# Altium integrated library WE_WR-TBL_Pluggable System_5.00 mm_rev15b.IntLib: 66 symbols
Pins are listed as number, name and electrical type; pins without a type are passive.

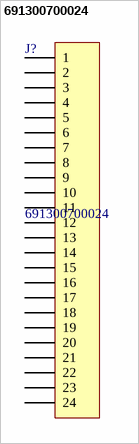
[diagram p0: symbol 691300700024]

## 691300700024
designator J?
WR-TBL Terminal block - serie 300 - 5.00mm; Manufacturer: Würth Elektronik eiSos GmbH; ComponentLink1 Description: Manufacturer; ComponentLink2 Description: Datasheet; NoPins: 24; Created Date: 6 January 2014; partNo: 691300700024; ComponentLink1URL: http://www.we-online.com; ComponentLink2URL: http://katalog.we-online.de/em/datasheet/6913007000xx.pdf; Created by: Karrer Zheng
footprint 691300700024 (5.0mm pin header - 24p)
pins: 1, 2, 3, 4, 5, 6, 7, 8, 9, 10, 11, 12, 13, 14, 15, 16, 17, 18, 19, 20, 21, 22, 23, 24


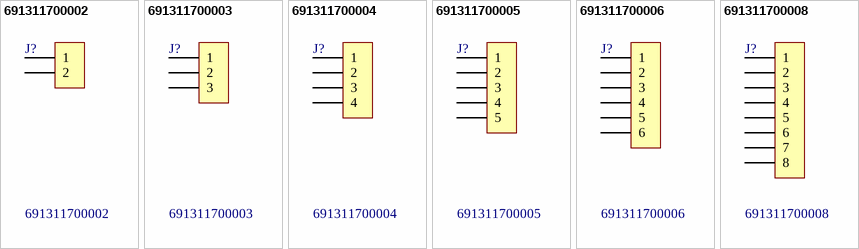
[diagram p1: symbols 691311700002 to 691311700008]

## 691311700002
designator J?
WR-TBL Terminal block - serie 3117 - 5.00mm; Manufacturer: Würth Elektronik eiSos GmbH; ComponentLink1 Description: Manufacturer; ComponentLink2 Description: Datasheet; NoPins: 02; Created Date: 6 January 2014; partNo: 691311700002; ComponentLink1URL: http://www.we-online.com; ComponentLink2URL: http://katalog.we-online.de/em/datasheet/6913117000xx.pdf; Created by: Karrer Zheng
footprint 691311700002
pins: 1, 2

## 691311700003
designator J?
WR-TBL Terminal block - serie 3117 - 5.00mm; Manufacturer: Würth Elektronik eiSos GmbH; ComponentLink1 Description: Manufacturer; ComponentLink2 Description: Datasheet; NoPins: 03; Created Date: 6 January 2014; partNo: 691311700003; ComponentLink1URL: http://www.we-online.com; ComponentLink2URL: http://katalog.we-online.de/em/datasheet/6913117000xx.pdf; Created by: Karrer Zheng
footprint 691311700003
pins: 1, 2, 3

## 691311700004
designator J?
WR-TBL Terminal block - serie 3117 - 5.00mm; Manufacturer: Würth Elektronik eiSos GmbH; ComponentLink1 Description: Manufacturer; ComponentLink2 Description: Datasheet; NoPins: 04; Created Date: 6 January 2014; partNo: 691311700004; ComponentLink1URL: http://www.we-online.com; ComponentLink2URL: http://katalog.we-online.de/em/datasheet/6913117000xx.pdf; Created by: Karrer Zheng
footprint 691311700004
pins: 1, 2, 3, 4

## 691311700005
designator J?
WR-TBL Terminal block - serie 3117 - 5.00mm; Manufacturer: Würth Elektronik eiSos GmbH; ComponentLink1 Description: Manufacturer; ComponentLink2 Description: Datasheet; NoPins: 05; Created Date: 6 January 2014; partNo: 691311700005; ComponentLink1URL: http://www.we-online.com; ComponentLink2URL: http://katalog.we-online.de/em/datasheet/6913117000xx.pdf; Created by: Karrer Zheng
footprint 691311700005
pins: 1, 2, 3, 4, 5

## 691311700006
designator J?
WR-TBL Terminal block - serie 3117 - 5.00mm; Manufacturer: Würth Elektronik eiSos GmbH; ComponentLink1 Description: Manufacturer; ComponentLink2 Description: Datasheet; NoPins: 06; Created Date: 6 January 2014; partNo: 691311700006; ComponentLink1URL: http://www.we-online.com; ComponentLink2URL: http://katalog.we-online.de/em/datasheet/6913117000xx.pdf; Created by: Karrer Zheng
footprint 691311700006
pins: 1, 2, 3, 4, 5, 6

## 691311700008
designator J?
WR-TBL Terminal block - serie 3117 - 5.00mm; Manufacturer: Würth Elektronik eiSos GmbH; ComponentLink1 Description: Manufacturer; ComponentLink2 Description: Datasheet; NoPins: 08; Created Date: 6 January 2014; partNo: 691311700008; ComponentLink1URL: http://www.we-online.com; ComponentLink2URL: http://katalog.we-online.de/em/datasheet/6913117000xx.pdf; Created by: Karrer Zheng
footprint 691311700008
pins: 1, 2, 3, 4, 5, 6, 7, 8


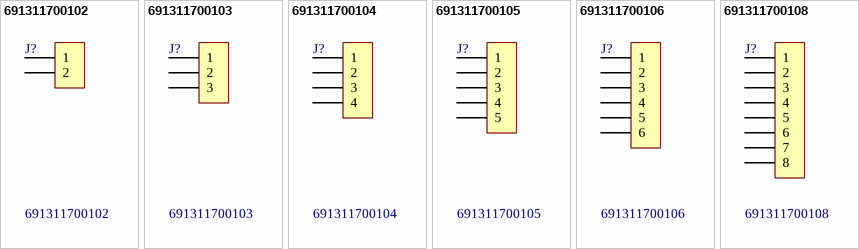
[diagram p2: symbols 691311700102 to 691311700108]

## 691311700102
designator J?
WR-TBL Terminal block - serie 3117 - 5.00mm; Manufacturer: Würth Elektronik eiSos GmbH; ComponentLink1 Description: Manufacturer; ComponentLink2 Description: Datasheet; NoPins: 02; Created Date: 6 January 2014; partNo: 691311700102; ComponentLink1URL: http://www.we-online.com; ComponentLink2URL: http://katalog.we-online.de/em/datasheet/6913117001xx.pdf; Created by: Karrer Zheng
footprint 691311700102 (5.00mm - PCB Vertical Closed - 02p)
pins: 1, 2

## 691311700103
designator J?
WR-TBL Terminal block - serie 3117 - 5.00mm; Manufacturer: Würth Elektronik eiSos GmbH; ComponentLink1 Description: Manufacturer; ComponentLink2 Description: Datasheet; NoPins: 03; Created Date: 6 January 2014; partNo: 691311700103; ComponentLink1URL: http://www.we-online.com; ComponentLink2URL: http://katalog.we-online.de/em/datasheet/6913117001xx.pdf; Created by: Karrer Zheng
footprint 691311700103 (5.00mm - PCB Vertical Closed - 03p)
pins: 1, 2, 3

## 691311700104
designator J?
WR-TBL Terminal block - serie 3117 - 5.00mm; Manufacturer: Würth Elektronik eiSos GmbH; ComponentLink1 Description: Manufacturer; ComponentLink2 Description: Datasheet; NoPins: 04; Created Date: 6 January 2014; partNo: 691311700104; ComponentLink1URL: http://www.we-online.com; ComponentLink2URL: http://katalog.we-online.de/em/datasheet/6913117001xx.pdf; Created by: Karrer Zheng
footprint 691311700104 (5.00mm - PCB Vertical Closed - 04p)
pins: 1, 2, 3, 4

## 691311700105
designator J?
WR-TBL Terminal block - serie 3117 - 5.00mm; Manufacturer: Würth Elektronik eiSos GmbH; ComponentLink1 Description: Manufacturer; ComponentLink2 Description: Datasheet; NoPins: 05; Created Date: 6 January 2014; partNo: 691311700105; ComponentLink1URL: http://www.we-online.com; ComponentLink2URL: http://katalog.we-online.de/em/datasheet/6913117001xx.pdf; Created by: Karrer Zheng
footprint 691311700105 (5.00mm - PCB Vertical Closed - 05p)
pins: 1, 2, 3, 4, 5

## 691311700106
designator J?
WR-TBL Terminal block - serie 3117 - 5.00mm; Manufacturer: Würth Elektronik eiSos GmbH; ComponentLink1 Description: Manufacturer; ComponentLink2 Description: Datasheet; NoPins: 06; Created Date: 6 January 2014; partNo: 691311700106; ComponentLink1URL: http://www.we-online.com; ComponentLink2URL: http://katalog.we-online.de/em/datasheet/6913117001xx.pdf; Created by: Karrer Zheng
footprint 691311700106 (5.00mm - PCB Vertical Closed - 06p)
pins: 1, 2, 3, 4, 5, 6

## 691311700108
designator J?
WR-TBL Terminal block - serie 3117 - 5.00mm; Manufacturer: Würth Elektronik eiSos GmbH; ComponentLink1 Description: Manufacturer; ComponentLink2 Description: Datasheet; NoPins: 08; Created Date: 6 January 2014; partNo: 691311700108; ComponentLink1URL: http://www.we-online.com; ComponentLink2URL: http://katalog.we-online.de/em/datasheet/6913117001xx.pdf; Created by: Karrer Zheng
footprint 691311700108 (5.00mm - PCB Vertical Closed - 08p)
pins: 1, 2, 3, 4, 5, 6, 7, 8


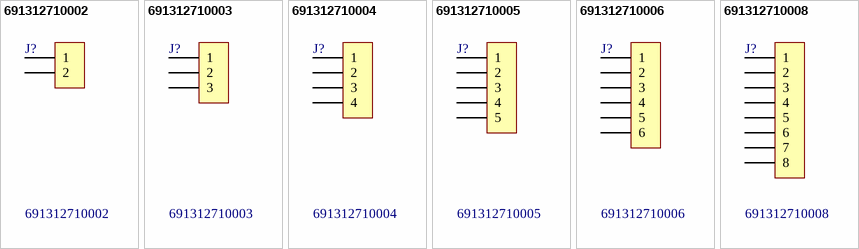
[diagram p3: symbols 691312710002 to 691312710008]

## 691312710002
designator J?
WR-TBL Terminal block - serie 3127 - 5.00mm; Manufacturer: Würth Elektronik eiSos GmbH; ComponentLink1 Description: Manufacturer; ComponentLink2 Description: Datasheet; NoPins: 02; Created Date: 6 January 2014; partNo: 691312710002; ComponentLink1URL: http://www.we-online.com; ComponentLink2URL: http://katalog.we-online.de/em/datasheet/6913127100xx.pdf; Created by: Karrer Zheng
footprint 691312710002
pins: 1, 2

## 691312710003
designator J?
WR-TBL Terminal block - serie 3127 - 5.00mm; Manufacturer: Würth Elektronik eiSos GmbH; ComponentLink1 Description: Manufacturer; ComponentLink2 Description: Datasheet; NoPins: 03; Created Date: 6 January 2014; partNo: 691312710003; ComponentLink1URL: http://www.we-online.com; ComponentLink2URL: http://katalog.we-online.de/em/datasheet/6913127100xx.pdf; Created by: Karrer Zheng
footprint 691312710003
pins: 1, 2, 3

## 691312710004
designator J?
WR-TBL Terminal block - serie 3127 - 5.00mm; Manufacturer: Würth Elektronik eiSos GmbH; ComponentLink1 Description: Manufacturer; ComponentLink2 Description: Datasheet; NoPins: 04; Created Date: 6 January 2014; partNo: 691312710004; ComponentLink1URL: http://www.we-online.com; ComponentLink2URL: http://katalog.we-online.de/em/datasheet/6913127100xx.pdf; Created by: Karrer Zheng
footprint 691312710004
pins: 1, 2, 3, 4

## 691312710005
designator J?
WR-TBL Terminal block - serie 3127 - 5.00mm; Manufacturer: Würth Elektronik eiSos GmbH; ComponentLink1 Description: Manufacturer; ComponentLink2 Description: Datasheet; NoPins: 05; Created Date: 6 January 2014; partNo: 691312710005; ComponentLink1URL: http://www.we-online.com; ComponentLink2URL: http://katalog.we-online.de/em/datasheet/6913127100xx.pdf; Created by: Karrer Zheng
footprint 691312710005
pins: 1, 2, 3, 4, 5

## 691312710006
designator J?
WR-TBL Terminal block - serie 3127 - 5.00mm; Manufacturer: Würth Elektronik eiSos GmbH; ComponentLink1 Description: Manufacturer; ComponentLink2 Description: Datasheet; NoPins: 06; Created Date: 6 January 2014; partNo: 691312710006; ComponentLink1URL: http://www.we-online.com; ComponentLink2URL: http://katalog.we-online.de/em/datasheet/6913127100xx.pdf; Created by: Karrer Zheng
footprint 691312710006
pins: 1, 2, 3, 4, 5, 6

## 691312710008
designator J?
WR-TBL Terminal block - serie 3127 - 5.00mm; Manufacturer: Würth Elektronik eiSos GmbH; ComponentLink1 Description: Manufacturer; ComponentLink2 Description: Datasheet; NoPins: 08; Created Date: 6 January 2014; partNo: 691312710008; ComponentLink1URL: http://www.we-online.com; ComponentLink2URL: http://katalog.we-online.de/em/datasheet/6913127100xx.pdf; Created by: Karrer Zheng
footprint 691312710008
pins: 1, 2, 3, 4, 5, 6, 7, 8


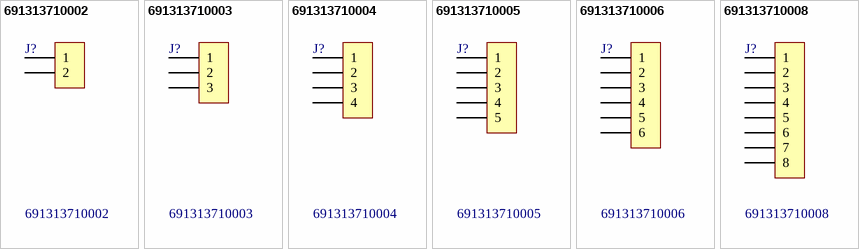
[diagram p4: symbols 691313710002 to 691313710008]

## 691313710002
designator J?
WR-TBL Terminal block - serie 3137 - 5.00mm; Manufacturer: Würth Elektronik eiSos GmbH; ComponentLink1 Description: Manufacturer; ComponentLink2 Description: Datasheet; NoPins: 02; Created Date: 6 January 2014; partNo: 691313710002; ComponentLink1URL: http://www.we-online.com; ComponentLink2URL: http://katalog.we-online.de/em/datasheet/691313710xx.pdf; Created by: Karrer Zheng
footprint 691313710002
pins: 1, 2

## 691313710003
designator J?
WR-TBL Terminal block - serie 3137 - 5.00mm; Manufacturer: Würth Elektronik eiSos GmbH; ComponentLink1 Description: Manufacturer; ComponentLink2 Description: Datasheet; NoPins: 03; Created Date: 6 January 2014; partNo: 691313710003; ComponentLink1URL: http://www.we-online.com; ComponentLink2URL: http://katalog.we-online.de/em/datasheet/691313710xx.pdf; Created by: Karrer Zheng
footprint 691313710003
pins: 1, 2, 3

## 691313710004
designator J?
WR-TBL Terminal block - serie 3137 - 5.00mm; Manufacturer: Würth Elektronik eiSos GmbH; ComponentLink1 Description: Manufacturer; ComponentLink2 Description: Datasheet; NoPins: 04; Created Date: 6 January 2014; partNo: 691313710004; ComponentLink1URL: http://www.we-online.com; ComponentLink2URL: http://katalog.we-online.de/em/datasheet/691313710xx.pdf; Created by: Karrer Zheng
footprint 691313710004
pins: 1, 2, 3, 4

## 691313710005
designator J?
WR-TBL Terminal block - serie 3137 - 5.00mm; Manufacturer: Würth Elektronik eiSos GmbH; ComponentLink1 Description: Manufacturer; ComponentLink2 Description: Datasheet; NoPins: 05; Created Date: 6 January 2014; partNo: 691313710005; ComponentLink1URL: http://www.we-online.com; ComponentLink2URL: http://katalog.we-online.de/em/datasheet/691313710xx.pdf; Created by: Karrer Zheng
footprint 691313710005
pins: 1, 2, 3, 4, 5

## 691313710006
designator J?
WR-TBL Terminal block - serie 3137 - 5.00mm; Manufacturer: Würth Elektronik eiSos GmbH; ComponentLink1 Description: Manufacturer; ComponentLink2 Description: Datasheet; NoPins: 06; Created Date: 6 January 2014; partNo: 691313710006; ComponentLink1URL: http://www.we-online.com; ComponentLink2URL: http://katalog.we-online.de/em/datasheet/691313710xx.pdf; Created by: Karrer Zheng
footprint 691313710006
pins: 1, 2, 3, 4, 5, 6

## 691313710008
designator J?
WR-TBL Terminal block - serie 3137 - 5.00mm; Manufacturer: Würth Elektronik eiSos GmbH; ComponentLink1 Description: Manufacturer; ComponentLink2 Description: Datasheet; NoPins: 08; Created Date: 6 January 2014; partNo: 691313710008; ComponentLink1URL: http://www.we-online.com; ComponentLink2URL: http://katalog.we-online.de/em/datasheet/691313710xx.pdf; Created by: Karrer Zheng
footprint 691313710008
pins: 1, 2, 3, 4, 5, 6, 7, 8


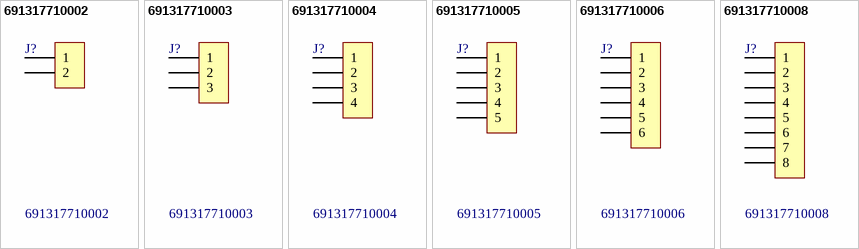
[diagram p5: symbols 691317710002 to 691317710008]

## 691317710002
designator J?
WR-TBL Terminal block - serie 3177 - 5.00mm; Manufacturer: Würth Elektronik eiSos GmbH; ComponentLink1 Description: Manufacturer; ComponentLink2 Description: Datasheet; NoPins: 02; Created Date: 6 January 2014; partNo: 691317710002; ComponentLink1URL: http://www.we-online.com; ComponentLink2URL: http://katalog.we-online.de/em/datasheet/6913177100xx.pdf; Created by: Karrer Zheng
footprint 691317710002
pins: 1, 2

## 691317710003
designator J?
WR-TBL Terminal block - serie 3177 - 5.00mm; Manufacturer: Würth Elektronik eiSos GmbH; ComponentLink1 Description: Manufacturer; ComponentLink2 Description: Datasheet; NoPins: 03; Created Date: 6 January 2014; partNo: 691317710003; ComponentLink1URL: http://www.we-online.com; ComponentLink2URL: http://katalog.we-online.de/em/datasheet/6913177100xx.pdf; Created by: Karrer Zheng
footprint 691317710003
pins: 1, 2, 3

## 691317710004
designator J?
WR-TBL Terminal block - serie 3177 - 5.00mm; Manufacturer: Würth Elektronik eiSos GmbH; ComponentLink1 Description: Manufacturer; ComponentLink2 Description: Datasheet; NoPins: 04; Created Date: 6 January 2014; partNo: 691317710004; ComponentLink1URL: http://www.we-online.com; ComponentLink2URL: http://katalog.we-online.de/em/datasheet/6913177100xx.pdf; Created by: Karrer Zheng
footprint 691317710004
pins: 1, 2, 3, 4

## 691317710005
designator J?
WR-TBL Terminal block - serie 3177 - 5.00mm; Manufacturer: Würth Elektronik eiSos GmbH; ComponentLink1 Description: Manufacturer; ComponentLink2 Description: Datasheet; NoPins: 05; Created Date: 6 January 2014; partNo: 691317710005; ComponentLink1URL: http://www.we-online.com; ComponentLink2URL: http://katalog.we-online.de/em/datasheet/6913177100xx.pdf; Created by: Karrer Zheng
footprint 691317710005
pins: 1, 2, 3, 4, 5

## 691317710006
designator J?
WR-TBL Terminal block - serie 3177 - 5.00mm; Manufacturer: Würth Elektronik eiSos GmbH; ComponentLink1 Description: Manufacturer; ComponentLink2 Description: Datasheet; NoPins: 06; Created Date: 6 January 2014; partNo: 691317710006; ComponentLink1URL: http://www.we-online.com; ComponentLink2URL: http://katalog.we-online.de/em/datasheet/6913177100xx.pdf; Created by: Karrer Zheng
footprint 691317710006
pins: 1, 2, 3, 4, 5, 6

## 691317710008
designator J?
WR-TBL Terminal block - serie 3177 - 5.00mm; Manufacturer: Würth Elektronik eiSos GmbH; ComponentLink1 Description: Manufacturer; ComponentLink2 Description: Datasheet; NoPins: 08; Created Date: 6 January 2014; partNo: 691317710008; ComponentLink1URL: http://www.we-online.com; ComponentLink2URL: http://katalog.we-online.de/em/datasheet/6913177100xx.pdf; Created by: Karrer Zheng
footprint 691317710008
pins: 1, 2, 3, 4, 5, 6, 7, 8


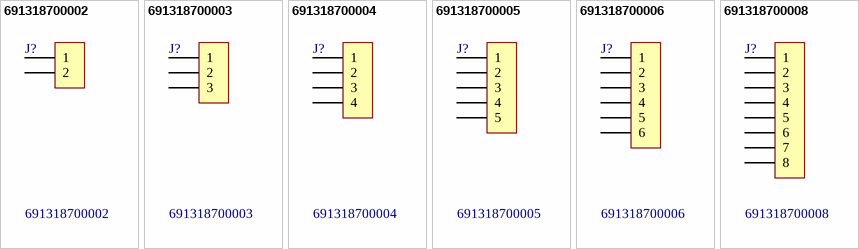
[diagram p6: symbols 691318700002 to 691318700008]

## 691318700002
designator J?
WR-TBL Terminal block - serie 3187 - 5.00mm; Manufacturer: Würth Elektronik eiSos GmbH; ComponentLink1 Description: Manufacturer; ComponentLink2 Description: Datasheet; NoPins: 02; Created Date: 6 January 2014; partNo: 691318700002; ComponentLink1URL: http://www.we-online.com; ComponentLink2URL: http://katalog.we-online.de/em/datasheet/6913187000xx.pdf; Created by: Karrer Zheng
footprint 691318700002
pins: 1, 2

## 691318700003
designator J?
WR-TBL Terminal block - serie 3187 - 5.00mm; Manufacturer: Würth Elektronik eiSos GmbH; ComponentLink1 Description: Manufacturer; ComponentLink2 Description: Datasheet; NoPins: 03; Created Date: 6 January 2014; partNo: 691318700003; ComponentLink1URL: http://www.we-online.com; ComponentLink2URL: http://katalog.we-online.de/em/datasheet/6913187000xx.pdf; Created by: Karrer Zheng
footprint 691318700003
pins: 1, 2, 3

## 691318700004
designator J?
WR-TBL Terminal block - serie 3187 - 5.00mm; Manufacturer: Würth Elektronik eiSos GmbH; ComponentLink1 Description: Manufacturer; ComponentLink2 Description: Datasheet; NoPins: 04; Created Date: 6 January 2014; partNo: 691318700004; ComponentLink1URL: http://www.we-online.com; ComponentLink2URL: http://katalog.we-online.de/em/datasheet/6913187000xx.pdf; Created by: Karrer Zheng
footprint 691318700004
pins: 1, 2, 3, 4

## 691318700005
designator J?
WR-TBL Terminal block - serie 3187 - 5.00mm; Manufacturer: Würth Elektronik eiSos GmbH; ComponentLink1 Description: Manufacturer; ComponentLink2 Description: Datasheet; NoPins: 05; Created Date: 6 January 2014; partNo: 691318700005; ComponentLink1URL: http://www.we-online.com; ComponentLink2URL: http://katalog.we-online.de/em/datasheet/6913187000xx.pdf; Created by: Karrer Zheng
footprint 691318700005
pins: 1, 2, 3, 4, 5

## 691318700006
designator J?
WR-TBL Terminal block - serie 3187 - 5.00mm; Manufacturer: Würth Elektronik eiSos GmbH; ComponentLink1 Description: Manufacturer; ComponentLink2 Description: Datasheet; NoPins: 06; Created Date: 6 January 2014; partNo: 691318700006; ComponentLink1URL: http://www.we-online.com; ComponentLink2URL: http://katalog.we-online.de/em/datasheet/6913187000xx.pdf; Created by: Karrer Zheng
footprint 691318700006
pins: 1, 2, 3, 4, 5, 6

## 691318700008
designator J?
WR-TBL Terminal block - serie 3187 - 5.00mm; Manufacturer: Würth Elektronik eiSos GmbH; ComponentLink1 Description: Manufacturer; ComponentLink2 Description: Datasheet; NoPins: 08; Created Date: 6 January 2014; partNo: 691318700008; ComponentLink1URL: http://www.we-online.com; ComponentLink2URL: http://katalog.we-online.de/em/datasheet/6913187000xx.pdf; Created by: Karrer Zheng
footprint 691318700008
pins: 1, 2, 3, 4, 5, 6, 7, 8


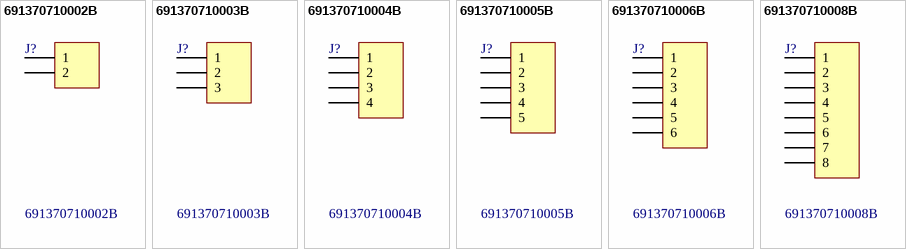
[diagram p7: symbols 691370710002B to 691370710008B]

## 691370710002B
designator J?
WR-TBL Terminal block - serie 370 B - 5.00mm; Manufacturer: Würth Elektronik eiSos GmbH; ComponentLink1 Description: Manufacturer; ComponentLink2 Description: Datasheet; NoPins: 02; Created Date: 8 January 2014; partNo: 691370710002B; ComponentLink1URL: http://www.we-online.com; ComponentLink2URL: http://katalog.we-online.de/em/datasheet/6913707100xxB.pdf; Created by: Karrer Zheng
footprint 691370710002B (5,00mm - PCB Horizontal with strong retention force between male and female housing - grey - 02p)
pins: 1, 2

## 691370710003B
designator J?
WR-TBL Terminal block - serie 370 B  - 5.00mm; Manufacturer: Würth Elektronik eiSos GmbH; ComponentLink1 Description: Manufacturer; ComponentLink2 Description: Datasheet; NoPins: 03; Created Date: 8 January 2014; partNo: 691370710003B; ComponentLink1URL: http://www.we-online.com; ComponentLink2URL: http://katalog.we-online.de/em/datasheet/6913707100xxB.pdf; Created by: Karrer Zheng
footprint 691370710003B (5,00mm - PCB Horizontal with strong retention force between male and female housing - grey - 03p)
pins: 1, 2, 3

## 691370710004B
designator J?
WR-TBL Terminal block - serie 370 B - 5.00mm; Manufacturer: Würth Elektronik eiSos GmbH; ComponentLink1 Description: Manufacturer; ComponentLink2 Description: Datasheet; NoPins: 04; Created Date: 8 January 2014; partNo: 691370710004B; ComponentLink1URL: http://www.we-online.com; ComponentLink2URL: http://katalog.we-online.de/em/datasheet/6913707100xxB.pdf; Created by: Karrer Zheng
footprint 691370710004B (5,00mm - PCB Horizontal with strong retention force between male and female housing - grey - 04p)
pins: 1, 2, 3, 4

## 691370710005B
designator J?
WR-TBL Terminal block - serie 370 B - 5.00mm; Manufacturer: Würth Elektronik eiSos GmbH; ComponentLink1 Description: Manufacturer; ComponentLink2 Description: Datasheet; NoPins: 05; Created Date: 8 January 2014; partNo: 691370710005B; ComponentLink1URL: http://www.we-online.com; ComponentLink2URL: http://katalog.we-online.de/em/datasheet/6913707100xxB.pdf; Created by: Karrer Zheng
footprint 691370710005B (5,00mm - PCB Horizontal with strong retention force between male and female housing - grey - 05p)
pins: 1, 2, 3, 4, 5

## 691370710006B
designator J?
WR-TBL Terminal block - serie 370 B - 5.00mm; Manufacturer: Würth Elektronik eiSos GmbH; ComponentLink1 Description: Manufacturer; ComponentLink2 Description: Datasheet; NoPins: 06; Created Date: 8 January 2014; partNo: 691370710006B; ComponentLink1URL: http://www.we-online.com; ComponentLink2URL: http://katalog.we-online.de/em/datasheet/6913707100xxB.pdf; Created by: Karrer Zheng
footprint 691370710006B (5,00mm - PCB Horizontal with strong retention force between male and female housing - grey - 06p)
pins: 1, 2, 3, 4, 5, 6

## 691370710008B
designator J?
WR-TBL Terminal block - serie 370 B - 5.00mm; Manufacturer: Würth Elektronik eiSos GmbH; ComponentLink1 Description: Manufacturer; ComponentLink2 Description: Datasheet; NoPins: 08; Created Date: 8 January 2014; partNo: 691370710008B; ComponentLink1URL: http://www.we-online.com; ComponentLink2URL: http://katalog.we-online.de/em/datasheet/6913707100xxB.pdf; Created by: Karrer Zheng
footprint 691370710008B (5,00mm - PCB Horizontal with strong retention force between male and female housing - grey - 08p)
pins: 1, 2, 3, 4, 5, 6, 7, 8


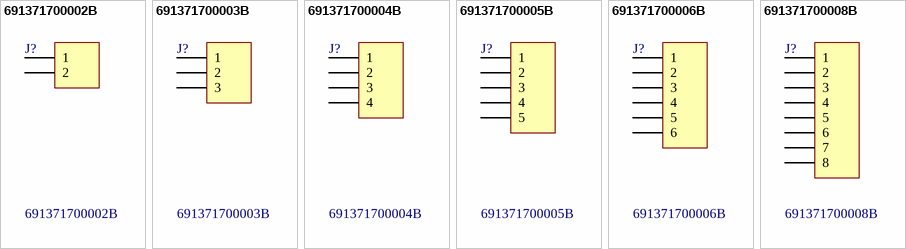
[diagram p8: symbols 691371700002B to 691371700008B]

## 691371700002B
designator J?
WR-TBL Terminal block - serie 371 B - 5.00mm; Manufacturer: Würth Elektronik eiSos GmbH; ComponentLink1 Description: Manufacturer; ComponentLink2 Description: Datasheet; NoPins: 02; Created Date: 8 January 2014; partNo: 691371700002B; ComponentLink1URL: http://www.we-online.com; ComponentLink2URL: http://katalog.we-online.de/em/datasheet/6913717000xxB.pdf; Created by: Karrer Zheng
footprint 691371700002B (5,00mm - PCB Vertical with strong retention force between male and female housing - grey - 02p)
pins: 1, 2

## 691371700003B
designator J?
WR-TBL Terminal block - serie 371 B - 5.00mm; Manufacturer: Würth Elektronik eiSos GmbH; ComponentLink1 Description: Manufacturer; ComponentLink2 Description: Datasheet; NoPins: 03; Created Date: 8 January 2014; partNo: 691371700003B; ComponentLink1URL: http://www.we-online.com; ComponentLink2URL: http://katalog.we-online.de/em/datasheet/6913717000xxB.pdf; Created by: Karrer Zheng
footprint 691371700003B (5,00mm - PCB Vertical with strong retention force between male and female housing - grey - 03p)
pins: 1, 2, 3

## 691371700004B
designator J?
WR-TBL Terminal block - serie 371 B - 5.00mm; Manufacturer: Würth Elektronik eiSos GmbH; ComponentLink1 Description: Manufacturer; ComponentLink2 Description: Datasheet; NoPins: 04; Created Date: 8 January 2014; partNo: 691371700004B; ComponentLink1URL: http://www.we-online.com; ComponentLink2URL: http://katalog.we-online.de/em/datasheet/6913717000xxB.pdf; Created by: Karrer Zheng
footprint 691371700004B (5,00mm - PCB Vertical with strong retention force between male and female housing - grey - 04p)
pins: 1, 2, 3, 4

## 691371700005B
designator J?
WR-TBL Terminal block - serie 371 B - 5.00mm; Manufacturer: Würth Elektronik eiSos GmbH; ComponentLink1 Description: Manufacturer; ComponentLink2 Description: Datasheet; NoPins: 05; Created Date: 8 January 2014; partNo: 691371700005B; ComponentLink1URL: http://www.we-online.com; ComponentLink2URL: http://katalog.we-online.de/em/datasheet/6913717000xxB.pdf; Created by: Karrer Zheng
footprint 691371700005B (5,00mm - PCB Vertical with strong retention force between male and female housing - grey - 05p)
pins: 1, 2, 3, 4, 5

## 691371700006B
designator J?
WR-TBL Terminal block - serie 371 B - 5.00mm; Manufacturer: Würth Elektronik eiSos GmbH; ComponentLink1 Description: Manufacturer; ComponentLink2 Description: Datasheet; NoPins: 06; Created Date: 8 January 2014; partNo: 691371700006B; ComponentLink1URL: http://www.we-online.com; ComponentLink2URL: http://katalog.we-online.de/em/datasheet/6913717000xxB.pdf; Created by: Karrer Zheng
footprint 691371700006B (5,00mm - PCB Vertical with strong retention force between male and female housing - grey - 06p)
pins: 1, 2, 3, 4, 5, 6

## 691371700008B
designator J?
WR-TBL Terminal block - serie 371 B - 5.00mm; Manufacturer: Würth Elektronik eiSos GmbH; ComponentLink1 Description: Manufacturer; ComponentLink2 Description: Datasheet; NoPins: 08; Created Date: 8 January 2014; partNo: 691371700008B; ComponentLink1URL: http://www.we-online.com; ComponentLink2URL: http://katalog.we-online.de/em/datasheet/6913717000xxB.pdf; Created by: Karrer Zheng
footprint 691371700008B (5,00mm - PCB Vertical with strong retention force between male and female housing - grey - 08p)
pins: 1, 2, 3, 4, 5, 6, 7, 8


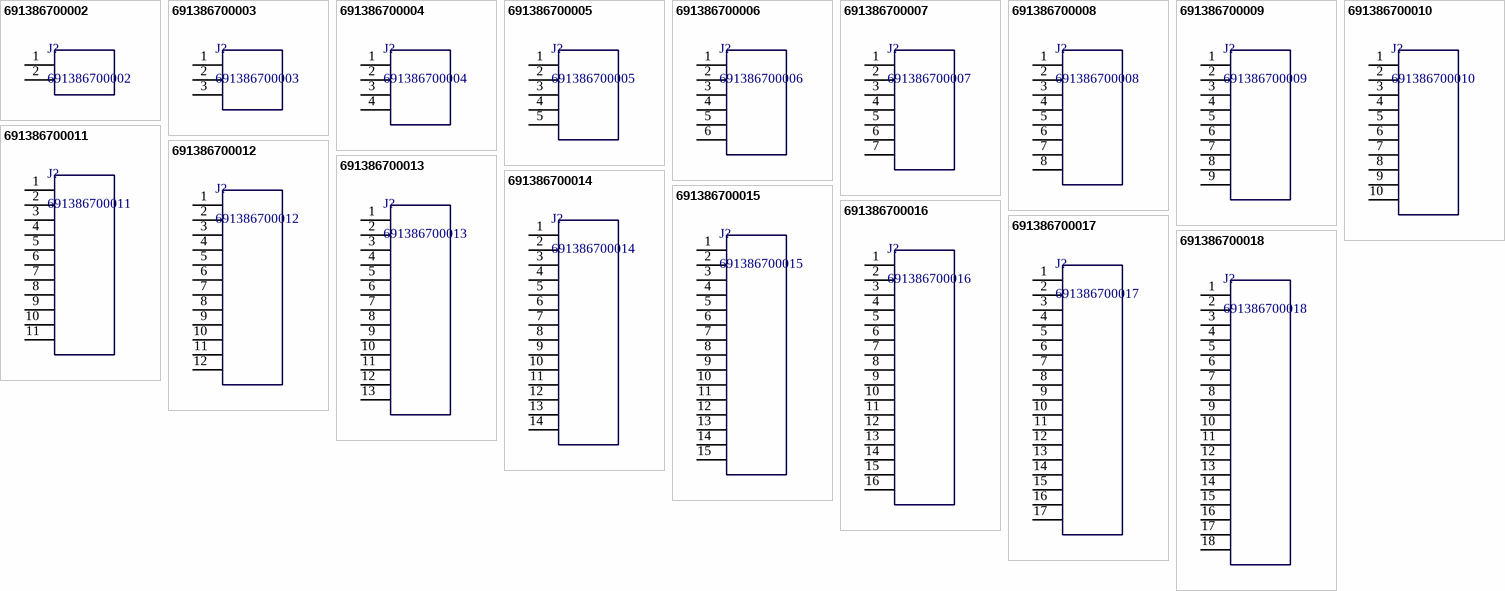
[diagram p9: symbols 691386700002 to 691386700018]

## 691386700002
designator J?
WR-TBL Terminal Blocks Serie 386 – 5.00 mm; Manufacturer: Würth Elektronik eiSos GmbH; ComponentLink1 Description: Manufacturer; ComponentLink2 Description: Datasheet; ComponentLink1URL: http://www.we-online.de; ComponentLink2URL: http://katalog.we-online.de/em/datasheet/6913867000xx.pdf; Created by: Karrer Zheng; Created Date: 10/23/2014; partNo: 691386700002
footprint 691386700002
pins: 1  , 2  

## 691386700003
designator J?
WR-TBL Terminal Blocks Serie 386 – 5.00 mm; Manufacturer: Würth Elektronik eiSos GmbH; ComponentLink1 Description: Manufacturer; ComponentLink2 Description: Datasheet; ComponentLink1URL: http://www.we-online.de; ComponentLink2URL: http://katalog.we-online.de/em/datasheet/6913867000xx.pdf; Created by: Karrer Zheng; Created Date: 10/23/2014; partNo: 691386700003
footprint 691386700003
pins: 1  , 2  , 3  

## 691386700004
designator J?
WR-TBL Terminal Blocks Serie 386 – 5.00 mm; Manufacturer: Würth Elektronik eiSos GmbH; ComponentLink1 Description: Manufacturer; ComponentLink2 Description: Datasheet; ComponentLink1URL: http://www.we-online.de; ComponentLink2URL: http://katalog.we-online.de/em/datasheet/6913867000xx.pdf; Created by: Karrer Zheng; Created Date: 10/23/2014; partNo: 691386700004
footprint 691386700004
pins: 1  , 2  , 3  , 4  

## 691386700005
designator J?
WR-TBL Terminal Blocks Serie 386 – 5.00 mm; Manufacturer: Würth Elektronik eiSos GmbH; ComponentLink1 Description: Manufacturer; ComponentLink2 Description: Datasheet; ComponentLink1URL: http://www.we-online.de; ComponentLink2URL: http://katalog.we-online.de/em/datasheet/6913867000xx.pdf; Created by: Karrer Zheng; Created Date: 10/23/2014; partNo: 691386700005
footprint 691386700005
pins: 1  , 2  , 3  , 4  , 5  

## 691386700006
designator J?
WR-TBL Terminal Blocks Serie 386 – 5.00 mm; Manufacturer: Würth Elektronik eiSos GmbH; ComponentLink1 Description: Manufacturer; ComponentLink2 Description: Datasheet; ComponentLink1URL: http://www.we-online.de; ComponentLink2URL: http://katalog.we-online.de/em/datasheet/6913867000xx.pdf; Created by: Karrer Zheng; Created Date: 10/23/2014; partNo: 691386700006
footprint 691386700006
pins: 1  , 2  , 3  , 4  , 5  , 6  

## 691386700007
designator J?
WR-TBL Terminal Blocks Serie 386 – 5.00 mm; Manufacturer: Würth Elektronik eiSos GmbH; ComponentLink1 Description: Manufacturer; ComponentLink2 Description: Datasheet; ComponentLink1URL: http://www.we-online.de; ComponentLink2URL: http://katalog.we-online.de/em/datasheet/6913867000xx.pdf; Created by: Karrer Zheng; Created Date: 10/23/2014; partNo: 691386700007
footprint 691386700007
pins: 1  , 2  , 3  , 4  , 5  , 6  , 7  

## 691386700008
designator J?
WR-TBL Terminal Blocks Serie 386 – 5.00 mm; Manufacturer: Würth Elektronik eiSos GmbH; ComponentLink1 Description: Manufacturer; ComponentLink2 Description: Datasheet; ComponentLink1URL: http://www.we-online.de; ComponentLink2URL: http://katalog.we-online.de/em/datasheet/6913867000xx.pdf; Created by: Karrer Zheng; Created Date: 10/23/2014; partNo: 691386700008
footprint 691386700008
pins: 1  , 2  , 3  , 4  , 5  , 6  , 7  , 8  

## 691386700009
designator J?
WR-TBL Terminal Blocks Serie 386 – 5.00 mm; Manufacturer: Würth Elektronik eiSos GmbH; ComponentLink1 Description: Manufacturer; ComponentLink2 Description: Datasheet; ComponentLink1URL: http://www.we-online.de; ComponentLink2URL: http://katalog.we-online.de/em/datasheet/6913867000xx.pdf; Created by: Karrer Zheng; Created Date: 10/23/2014; partNo: 691386700009
footprint 691386700009
pins: 1  , 2  , 3  , 4  , 5  , 6  , 7  , 8  , 9  

## 691386700010
designator J?
WR-TBL Terminal Blocks Serie 386 – 5.00 mm; Manufacturer: Würth Elektronik eiSos GmbH; ComponentLink1 Description: Manufacturer; ComponentLink2 Description: Datasheet; ComponentLink1URL: http://www.we-online.de; ComponentLink2URL: http://katalog.we-online.de/em/datasheet/6913867000xx.pdf; Created by: Karrer Zheng; Created Date: 10/23/2014; partNo: 691386700010
footprint 691386700010
pins: 1  , 2  , 3  , 4  , 5  , 6  , 7  , 8  , 9  , 10  

## 691386700011
designator J?
WR-TBL Terminal Blocks Serie 386 – 5.00 mm; Manufacturer: Würth Elektronik eiSos GmbH; ComponentLink1 Description: Manufacturer; ComponentLink2 Description: Datasheet; ComponentLink1URL: http://www.we-online.de; ComponentLink2URL: http://katalog.we-online.de/em/datasheet/6913867000xx.pdf; Created by: Karrer Zheng; Created Date: 10/23/2014; partNo: 691386700011
footprint 691386700011
pins: 1  , 2  , 3  , 4  , 5  , 6  , 7  , 8  , 9  , 10  , 11  

## 691386700012
designator J?
WR-TBL Terminal Blocks Serie 386 – 5.00 mm; Manufacturer: Würth Elektronik eiSos GmbH; ComponentLink1 Description: Manufacturer; ComponentLink2 Description: Datasheet; ComponentLink1URL: http://www.we-online.de; ComponentLink2URL: http://katalog.we-online.de/em/datasheet/6913867000xx.pdf; Created by: Karrer Zheng; Created Date: 10/23/2014; partNo: 691386700012
footprint 691386700012
pins: 1  , 2  , 3  , 4  , 5  , 6  , 7  , 8  , 9  , 10  , 11  , 12  

## 691386700013
designator J?
WR-TBL Terminal Blocks Serie 386 – 5.00 mm; Manufacturer: Würth Elektronik eiSos GmbH; ComponentLink1 Description: Manufacturer; ComponentLink2 Description: Datasheet; ComponentLink1URL: http://www.we-online.de; ComponentLink2URL: http://katalog.we-online.de/em/datasheet/6913867000xx.pdf; Created by: Karrer Zheng; Created Date: 10/23/2014; partNo: 691386700013
footprint 691386700013
pins: 1  , 2  , 3  , 4  , 5  , 6  , 7  , 8  , 9  , 10  , 11  , 12  , 13  

## 691386700014
designator J?
WR-TBL Terminal Blocks Serie 386 – 5.00 mm; Manufacturer: Würth Elektronik eiSos GmbH; ComponentLink1 Description: Manufacturer; ComponentLink2 Description: Datasheet; ComponentLink1URL: http://www.we-online.de; ComponentLink2URL: http://katalog.we-online.de/em/datasheet/6913867000xx.pdf; Created by: Karrer Zheng; Created Date: 10/23/2014; partNo: 691386700014
footprint 691386700014
pins: 1  , 2  , 3  , 4  , 5  , 6  , 7  , 8  , 9  , 10  , 11  , 12  , 13  , 14  

## 691386700015
designator J?
WR-TBL Terminal Blocks Serie 386 – 5.00 mm; Manufacturer: Würth Elektronik eiSos GmbH; ComponentLink1 Description: Manufacturer; ComponentLink2 Description: Datasheet; ComponentLink1URL: http://www.we-online.de; ComponentLink2URL: http://katalog.we-online.de/em/datasheet/6913867000xx.pdf; Created by: Karrer Zheng; Created Date: 10/23/2014; partNo: 691386700015
footprint 691386700015
pins: 1  , 2  , 3  , 4  , 5  , 6  , 7  , 8  , 9  , 10  , 11  , 12  , 13  , 14  , 15  

## 691386700016
designator J?
WR-TBL Terminal Blocks Serie 386 – 5.00 mm; Manufacturer: Würth Elektronik eiSos GmbH; ComponentLink1 Description: Manufacturer; ComponentLink2 Description: Datasheet; ComponentLink1URL: http://www.we-online.de; ComponentLink2URL: http://katalog.we-online.de/em/datasheet/6913867000xx.pdf; Created by: Karrer Zheng; Created Date: 10/23/2014; partNo: 691386700016
footprint 691386700016
pins: 1  , 2  , 3  , 4  , 5  , 6  , 7  , 8  , 9  , 10  , 11  , 12  , 13  , 14  , 15  , 16  

## 691386700017
designator J?
WR-TBL Terminal Blocks Serie 386 – 5.00 mm; Manufacturer: Würth Elektronik eiSos GmbH; ComponentLink1 Description: Manufacturer; ComponentLink2 Description: Datasheet; ComponentLink1URL: http://www.we-online.de; ComponentLink2URL: http://katalog.we-online.de/em/datasheet/6913867000xx.pdf; Created by: Karrer Zheng; Created Date: 10/23/2014; partNo: 691386700017
footprint 691386700017
pins: 1  , 2  , 3  , 4  , 5  , 6  , 7  , 8  , 9  , 10  , 11  , 12  , 13  , 14  , 15  , 16  , 17  

## 691386700018
designator J?
WR-TBL Terminal Blocks Serie 386 – 5.00 mm; Manufacturer: Würth Elektronik eiSos GmbH; ComponentLink1 Description: Manufacturer; ComponentLink2 Description: Datasheet; ComponentLink1URL: http://www.we-online.de; ComponentLink2URL: http://katalog.we-online.de/em/datasheet/6913867000xx.pdf; Created by: Karrer Zheng; Created Date: 10/23/2014; partNo: 691386700018
footprint 691386700018
pins: 1  , 2  , 3  , 4  , 5  , 6  , 7  , 8  , 9  , 10  , 11  , 12  , 13  , 14  , 15  , 16  , 17  , 18  